# Altium footprint library ADNB95C.PcbLib: 249 footprints (part 6 of 16)
Each footprint in its own frame and in the unit in brackets; x right, y up, seen from the top. Pads: shape width x height; smd on the part's side, far side on the other; paste and mask are expansions set on the pad; w line width, h text height; cw(c..) or ccw(c..) is an arc to the next point about the centre after c.
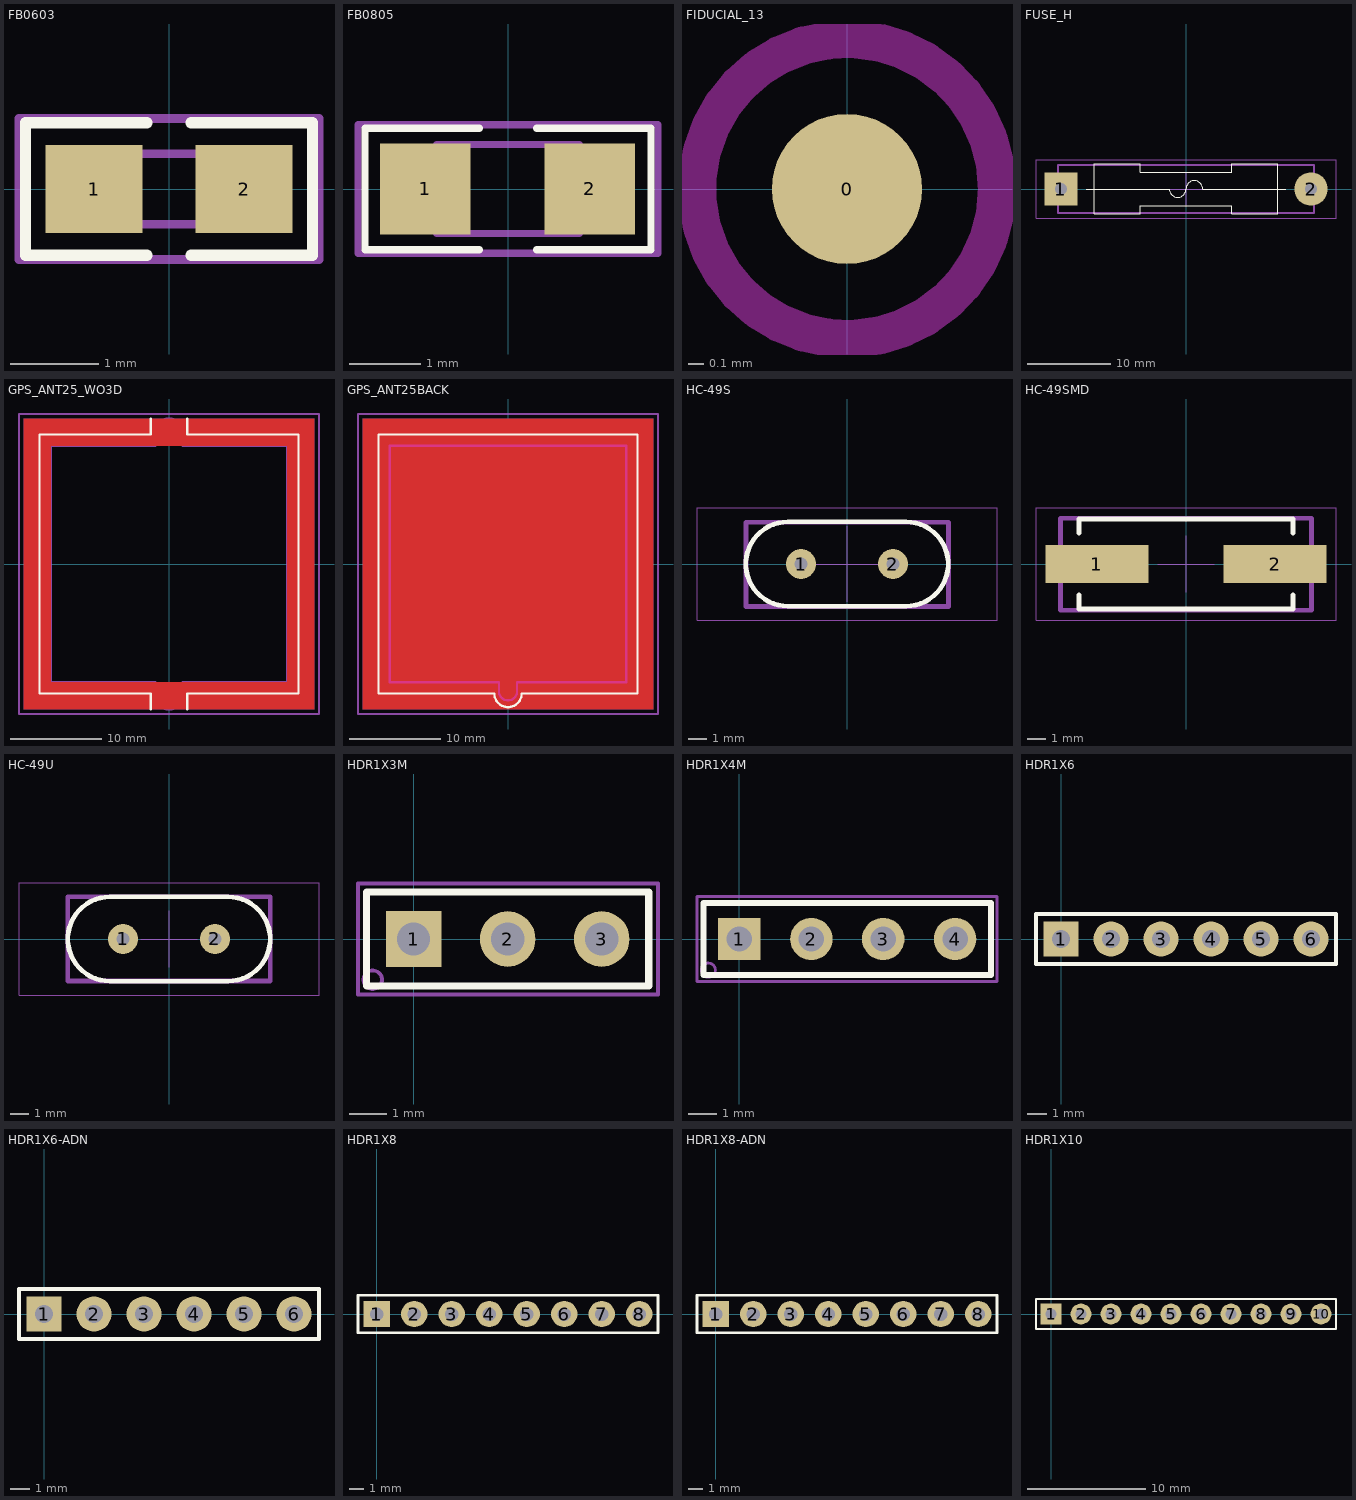
[diagram p5: the footprints below, top view; thin cyan lines are the x and y axes]

## FB0603 [mm] "Chip FB 0603"
height 0.6
pads (2):
  rect 1.1x1 smd: 1(-0.85,0) 2(0.85,0)
Top Overlay:
  lines w0.127: -0.25,-0.75 -1.625,-0.75 -1.625,0.75 -0.25,0.75 ; 0.25,-0.75 1.625,-0.75 1.625,0.75 0.25,0.75
Top Designator (Mech7):
  text ".Designator" at -3.809,-0.254 h0.76
Top Assembly:
  lines w0.1: -0.8,-0.4 -0.8,0.4 0.8,0.4 0.8,-0.4 -0.8,-0.4
Top Courtyard:
  lines w0.1: -1.7,-0.8 -1.7,0.8 1.7,0.8 1.7,-0.8 -1.7,-0.8
3D body "User Library-FB_1608.STEP": height 0.8, standoff 0, extent -0.8,-0.4 0.8,0.4

## FB0805 [mil] "Chip FB 0805 ;"
height 23.62
pads (2):
  rect 50x50 smd: 1(-45.55,0) 2(45,0)
Top Overlay:
  lines w3.94: -15.75,-33.47 -78.74,-33.47 -78.74,33.46 -15.75,33.46 ; 15.75,-33.47 78.74,-33.47 78.74,33.46 15.75,33.46
Top Designator (Mech7):
  text ".Designator" at -149.95,-10 h30
Top Assembly:
  lines w3.94: -39.37,-24.6 39.37,-24.6 39.37,24.61 -39.37,24.61 -39.37,-24.6
Top Courtyard:
  lines w3.94: -82.68,-35.43 82.68,-35.43 82.68,35.43 -82.68,35.43 -82.68,-35.43
3D body "User Library-FB_2012.STEP": height 33.46, standoff 0, extent -39.37,-24.61 39.37,24.61

## FIDUCIAL_13 [mm]
pads (1):
  round 1 smd paste-10 mask+1: 0(0,0)
Top Layer keep-out:
  circle w0.254: c0,0 r1
Top Designator (Mech7):
  text ".Designator" at -5.998,-0.4 h1.2

## FUSE_H [mm]
pads (2):
  rect 4x4 hole 1.5: 1(-15,0)
  round 4 hole 1.5: 2(15,0)
Top Overlay:
  lines w0.1: -12,0 -2,0 ccw(c-1,0) 0,0 cw(c1,0) 2,0 12,0 ; -11,-3 -11,3 -5.5,3 -5.5,2 5.5,2 5.5,3 11,3 11,-3 5.5,-3 5.5,-2 -5.5,-2 -5.5,-3 -11,-3
Top Designator (Mech7):
  text ".Designator" at -7.618,-0.508 h1.52
Top Assembly:
  lines w0.254: -15.35,-2.9 15.35,-2.9 15.35,2.9 -15.35,2.9 -15.35,-2.9
Top Courtyard:
  lines w0.05: -2,0 2,0 ; 0,-2 0,2 ; -18,-3.5 18,-3.5 18,3.5 -18,3.5 -18,-3.5
3D body "User Library-Fuse 218xxxxXEP.STEP": height 5.9, standoff -3, extent -15.35,-2.9 15.35,2.9

## GPS_ANT25_WO3D [mm] "dimension25x25x4.5"
height 4.5
Top Layer:
  pour cut-out: -16,16 16,16 16,-16 -16,-16 -16,13 -13,13 -13,-13 13,-13 13,13 -16,13
Bottom Layer:
  pour cut-out: 16,16 -16,16 -16,-16 16,-16 16,13 13,13 13,-13 -13,-13 -13,13 16,13
Top Overlay:
  lines w0.254: -2,-16 -2,-14.25 -14.25,-14.25 -14.25,14.25 -2,14.25 -2,16 ; 2,-16 2,-14.25 14.25,-14.25 14.25,14.25 2,14.25 2,16
Mechanical 1:
  lines w0.254: -13,-13 -1.5,-13 -1.5,-14.5 ccw(c0,-14.5) 1.5,-14.5 1.5,-13 13,-13 13,13 1.5,13 1.5,14.5 ccw(c0,14.5) -1.5,14.5 -1.5,13 -13,13 -13,-13
Top Designator (Mech7):
  text ".Designator" at -7.618,-0.508 h1.52
Top Courtyard:
  lines w0.254: -16.5,-16.5 16.5,-16.5 16.5,16.5 -16.5,16.5 -16.5,-16.5

## GPS_ANT25BACK [mm] "dimension25x25x4.5"
height 4.5
Top Layer:
  pour cut-out: -16,-16 16,-16 16,16 -16,16
Bottom Layer:
  pour cut-out: -16,16 -16,-16 16,-16 16,16
Top Overlay:
  lines w0.254: -14.25,-14.25 -1.5,-14.25 ccw(c0,-14.25) 1.5,-14.25 14.25,-14.25 14.25,14.25 -14.25,14.25 -14.25,-14.25
Keep-Out Layer:
  lines w0.254: -13,-13 -1,-13 -1,-14 ccw(c0,-14) 1,-14 1,-13 13,-13 13,13 -13,13 -13,-13
Top Designator (Mech7):
  text ".Designator" at -7.618,-0.508 h1.52
Top Assembly:
  lines w0.254: -12.5,-12.5 12.5,-12.5 12.5,-12.5 12.5,12.5 12.5,12.5 -12.5,12.5 -12.5,-12.5
Top Courtyard:
  lines w0.254: -2.5,0 2.5,0 ; 0,-2.5 0,2.5 ; -16.5,-16.5 16.5,-16.5 16.5,16.5 -16.5,16.5 -16.5,-16.5
3D body "User Library-ET1001039.STEP": height 3.02, standoff -4.48, extent -12.5,-12.5 12.5,12.5

## HC-49S [mm]
pads (2):
  round 1.6 hole 0.7: 1(-2.45,0) 2(2.45,0)
Top Overlay:
  lines w0.254: -3.15,-2.248 cw(c-3.15,0) -3.15,2.248 3.15,2.248 cw(c3.15,0) 3.15,-2.248 -3.15,-2.248
Top Designator (Mech7):
  text ".Designator" at -7.618,-0.508 h1.52
Top Assembly:
  lines w0.254: -5.388,-2.27 5.412,-2.27 5.412,2.23 -5.388,2.23 -5.388,-2.27
Top Courtyard:
  lines w0.05: -2,0 2,0 ; 0,-2 0,2 ; -8,-3 -8,3 8,3 8,-3 -8,-3
3D body "hc-49s_n.stp": height 3.6, standoff -2.9, extent -5.388,-2.27 5.412,2.23

## HC-49SMD [mm]
pads (2):
  rect 5.5x2 smd: 1(-4.75,0) 2(4.75,0)
Top Overlay:
  lines w0.254: -5.7,-1.65 -5.7,-2.4 5.7,-2.4 5.7,-1.65 ; -5.7,1.65 -5.7,2.4 5.7,2.4 5.7,1.65
Top Designator (Mech7):
  text ".Designator" at -7.618,-0.508 h1.52
Top Assembly:
  lines w0.254: -6.7,-2.462 -6.7,2.438 6.7,2.438 6.7,-2.462 -6.7,-2.462
Top Courtyard:
  lines w0.05: -1.5,0 1.5,0 ; 0,-1.5 0,1.5 ; -8,-3 -8,3 8,3 8,-3 -8,-3
3D body "User Library-hc49_cystal.STEP": height 4, standoff 0, extent -6.7,-2.462 6.7,2.438

## HC-49U [mm]
pads (2):
  round 1.6 hole 0.7: 1(-2.45,0) 2(2.45,0)
Top Overlay:
  lines w0.254: -3.15,-2.248 cw(c-3.15,0) -3.15,2.248 3.15,2.248 cw(c3.15,0) 3.15,-2.248 -3.15,-2.248
Top Designator (Mech7):
  text ".Designator" at -7.618,-0.508 h1.52
Top Assembly:
  lines w0.254: -5.398,-2.245 5.402,-2.245 5.402,2.255 -5.398,2.255 -5.398,-2.245
Top Courtyard:
  lines w0.05: -1.5,0 1.5,0 ; 0,-1.5 0,1.5 ; -8,-3 8,-3 8,3 -8,3 -8,-3
3D body "hc-49u_n.stp": height 13.1, standoff -2.9, extent -5.398,-2.245 5.402,2.255

## HDR1X3M [mm] "Connector; Header; 3 Position"
pads (3):
  rect 1.5x1.5 hole 0.9: 1(0,0)
  round 1.5 hole 0.9: 2(2.54,0) 3(5.08,0)
Top Overlay:
  lines w0.2: -1.27,-1.27 -1.27,1.27 6.35,1.27 6.35,-1.27 -1.27,-1.27
Top Designator (Mech7):
  text ".Designator" at -5.078,-0.508 h1.52
Top Courtyard:
  circle w0.1: c-1.1,-1.1 r0.25
  lines w0.1: -1.5,-1.5 6.6,-1.5 6.6,1.5 -1.5,1.5 -1.5,-1.5
3D body "User Library-Header_Male_3Pin.STEP": height 8.55, standoff -2.99, extent -1.27,-1.25 6.35,1.24

## HDR1X4M [mm] "Connector; Header; 4 Position"
height 18
pads (4):
  rect 1.5x1.5 hole 0.9: 1(0,0)
  round 1.5 hole 0.9: 2(2.54,0) 3(5.08,0) 4(7.62,0)
Top Overlay:
  lines w0.2: -1.27,-1.27 -1.27,1.27 8.89,1.27 8.89,-1.27 -1.27,-1.27
Top Designator (Mech7):
  text ".Designator" at -3.818,-0.508 h1.52
Top Courtyard:
  circle w0.1: c-1.1,-1.1 r0.25
  lines w0.1: -1.5,-1.5 -1.5,1.5 9.1,1.5 9.1,-1.5 -1.5,-1.5
3D body "pin_header_aw140-eg-g04b.stp": height 8.61, standoff -2.99, extent -1.175,-1.249 8.985,1.249

## HDR1X6 [mil] "Connector; Header; 6 Position"
height 433.07
pads (6):
  rect 70x70 hole 36: 1(0,0)
  round 70 hole 36: 2(100,0) 3(200,0) 4(300,0) 5(400,0) 6(500,0)
Top Overlay:
  lines w7.87: -50,-50 -50,50 550,50 550,-50 -50,-50
Top Designator (Mech7):
  text ".Designator" at -49.9,-19.99 h60

## HDR1X6-ADN [mil] "Connector; Header; 6 Position Arduino Stackable"
height 433.07
pads (6):
  rect 70x70 hole 36: 1(0,0)
  round 70 hole 36: 2(100,0) 3(200,0) 4(300,0) 5(400,0) 6(500,0)
Top Overlay:
  lines w7.87: -50,-50 550,-50 550,50 -50,50 -50,-50
Top Designator (Mech7):
  text ".Designator" at -49.9,-19.99 h60
3D body "User Library-SIL_Socket06_.STEP": height 334.65, standoff -411.79, extent -50,-50 550,50

## HDR1X8 [mil] "Connector; Header; 8 Position"
height 433.07
pads (8):
  rect 70x70 hole 36: 1(0,0)
  round 70 hole 36: 2(100,0) 3(200,0) 4(300,0) 5(400,0) 6(500,0) 7(600,0) 8(700,0)
Top Overlay:
  lines w7.87: -50,-50 -50,50 750,50 750,-50 -50,-50
Top Designator (Mech7):
  text ".Designator" at 50.1,-19.99 h60

## HDR1X8-ADN [mil] "Connector; Header; 8 Position Arduino Stackable"
height 433.07
pads (8):
  rect 70x70 hole 36: 1(0,0)
  round 70 hole 36: 2(100,0) 3(200,0) 4(300,0) 5(400,0) 6(500,0) 7(600,0) 8(700,0)
Top Overlay:
  lines w7.87: -50,-50 -50,50 750,50 750,-50 -50,-50
Top Designator (Mech7):
  text ".Designator" at 50.1,-19.99 h60
3D body "User Library-SIL_Socket08_.STEP": height 334.65, standoff -411.79, extent -50,-50 750,50

## HDR1X10 [mil] "Connector; Header; 10 Position"
height 433.07
pads (10):
  rect 70x70 hole 36: 1(0,0)
  round 70 hole 36: 2(100,0) 3(200,0) 4(300,0) 5(400,0) 6(500,0) 7(600,0) 8(700,0) 9(800,0) 10(900,0)
Top Overlay:
  lines w7.87: -50,-50 950,-50 950,50 25,50 -50,50 -50,-50
Top Designator (Mech7):
  text ".Designator" at 151.97,-19.99 h60
3D body "female_header_a-bl254-eg-g10d.stp": height 334.65, standoff -125.98, extent -52.17,-49.21 957.68,49.21